# Altium schematic symbol library TI Power Management Shunt Voltage Reference.SchLib: 1526 symbols (part 16 of 18)
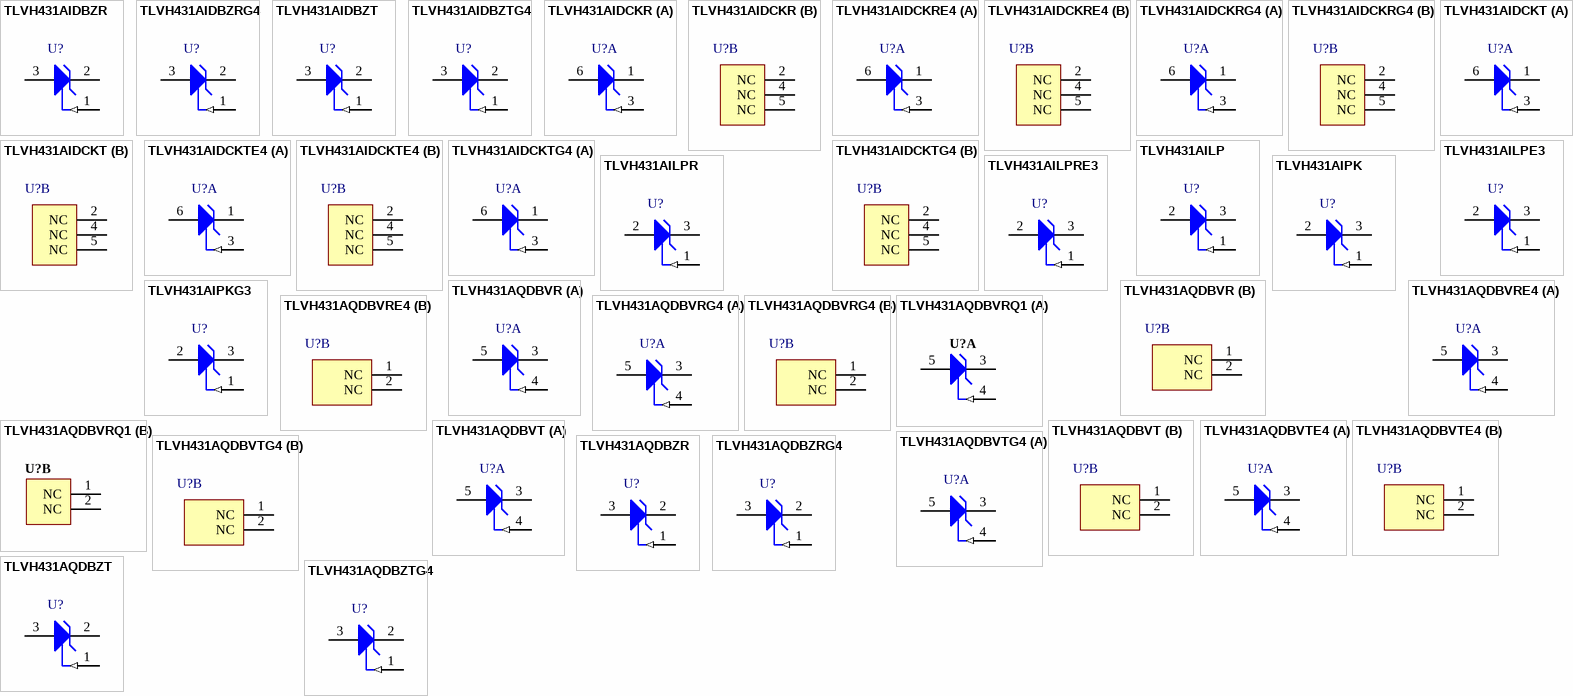
[diagram p72: symbols TLVH431AIDBZR to TLVH431AQDBZTG4]

## TLVH431AIDBZRG4
designator U?
Low-Voltage Adjustable Precision Shunt Regulator, 80 mA, -40 to 85 degC, 3-pin SOT-23 (DBZ), Green (RoHS & no Sb/Br); Manufacturer: Texas Instruments; PartNumber: TLVH431AIDBZRG4; Initial Accuracy @ 25/deg C(%): 1; Iout/Iz(Max)(mA): 80; Rating: Catalog; SubFamily: Shunt Voltage Reference; Temp Coeff(Max)(ppm/ degree C): 129; VO Adj(Max)(V): 18; VO Adj(Min)(V): 1.24; DatasheetVersion: SLVS555I; PackageVersion: 4203227/B; PackageReference: DBZ3; PackageDescription: 3-Pin Plastic Small Outline, Body 2.92 x 1.3 mm, Pitch 0.95 mm; Supplier 1: Digi-Key; Supplier Part Number 1: TLVH431AIDBZRG4-ND; Supplier 2: Mouser; Supplier Part Number 2: 595-TLVH431AIDBZRG4; Eco-Plan: Green (RoHS & no Sb/Br); Min Iz for Regulation(uA): 80; Mounting Technology: Surface Mount; Code_JEDEC: TO-236; ComponentLink1Description: Manufacturer URL; ComponentLink1URL: http://www.ti.com/; ComponentLink2Description: Datasheet; ComponentLink2URL: http://www.ti.com/general/docs/lit/getliterature.tsp?genericPartNumber=TLVH431A&fileType=pdf; ComponentLink3Description: Package Specification; ComponentLink3URL: http://www.ti.com/litv/pdf/mpds108a
footprint TI-DBZ3_N (SOT23, 3-Leads, Body 2.92x1.3 mm, Pitch 0.95 mm, IPC Medium Density)
pins: 1 REF (in), 2 CATHODE, 3 ANODE

## TLVH431AIDBZT
designator U?
Low-Voltage Adjustable Precision Shunt Regulator, 80 mA, -40 to 85 degC, 3-pin SOT-23 (DBZ), Green (RoHS & no Sb/Br); Manufacturer: Texas Instruments; PartNumber: TLVH431AIDBZT; Initial Accuracy @ 25/deg C(%): 1; Iout/Iz(Max)(mA): 80; Rating: Catalog; SubFamily: Shunt Voltage Reference; Temp Coeff(Max)(ppm/ degree C): 129; VO Adj(Max)(V): 18; VO Adj(Min)(V): 1.24; DatasheetVersion: SLVS555I; PackageVersion: 4203227/B; PackageReference: DBZ3; PackageDescription: 3-Pin Plastic Small Outline, Body 2.92 x 1.3 mm, Pitch 0.95 mm; Supplier 1: Digi-Key; Supplier Part Number 1: 296-26830-2-ND; Supplier 2: Digi-Key; Supplier Part Number 2: 296-26830-1-ND; Supplier 3: Digi-Key; Supplier Part Number 3: 296-26830-6-ND; Supplier 4: Mouser; Supplier Part Number 4: 595-TLVH431AIDBZT; Eco-Plan: Green (RoHS & no Sb/Br); Min Iz for Regulation(uA): 80; Mounting Technology: Surface Mount; Code_JEDEC: TO-236; ComponentLink1Description: Manufacturer URL; ComponentLink1URL: http://www.ti.com/; ComponentLink2Description: Datasheet; ComponentLink2URL: http://www.ti.com/general/docs/lit/getliterature.tsp?genericPartNumber=TLVH431A&fileType=pdf; ComponentLink3Description: Package Specification; ComponentLink3URL: http://www.ti.com/litv/pdf/mpds108a
footprint TI-DBZ3_N (SOT23, 3-Leads, Body 2.92x1.3 mm, Pitch 0.95 mm, IPC Medium Density)
pins: 1 REF (in), 2 CATHODE, 3 ANODE

## TLVH431AIDBZTG4
designator U?
Low-Voltage Adjustable Precision Shunt Regulator, 80 mA, -40 to 85 degC, 3-pin SOT-23 (DBZ), Green (RoHS & no Sb/Br); Manufacturer: Texas Instruments; PartNumber: TLVH431AIDBZTG4; Initial Accuracy @ 25/deg C(%): 1; Iout/Iz(Max)(mA): 80; Rating: Catalog; SubFamily: Shunt Voltage Reference; Temp Coeff(Max)(ppm/ degree C): 129; VO Adj(Max)(V): 18; VO Adj(Min)(V): 1.24; DatasheetVersion: SLVS555I; PackageVersion: 4203227/B; PackageReference: DBZ3; PackageDescription: 3-Pin Plastic Small Outline, Body 2.92 x 1.3 mm, Pitch 0.95 mm; Supplier 1: Digi-Key; Supplier Part Number 1: TLVH431AIDBZTG4-ND; Supplier 2: Newark; Supplier Part Number 2: 31K7653; Supplier 3: Mouser; Supplier Part Number 3: 595-TLVH431AIDBZTG4; Eco-Plan: Green (RoHS & no Sb/Br); Min Iz for Regulation(uA): 80; Mounting Technology: Surface Mount; Code_JEDEC: TO-236; ComponentLink1Description: Manufacturer URL; ComponentLink1URL: http://www.ti.com/; ComponentLink2Description: Datasheet; ComponentLink2URL: http://www.ti.com/general/docs/lit/getliterature.tsp?genericPartNumber=TLVH431A&fileType=pdf; ComponentLink3Description: Package Specification; ComponentLink3URL: http://www.ti.com/litv/pdf/mpds108a; ComponentLink4Description: URL Link1; ComponentLink4URL: Samples URL:http://www.ti.com/lit/ds/symlink/tlvh432.pdf
footprint TI-DBZ3_N (SOT23, 3-Leads, Body 2.92x1.3 mm, Pitch 0.95 mm, IPC Medium Density)
pins: 1 REF (in), 2 CATHODE, 3 ANODE

## TLVH431AIDCKR
designator U?
Low-Voltage Adjustable Precision Shunt Regulator, 80 mA, -40 to 85 degC, 6-pin SC70 (DCK), Green (RoHS & no Sb/Br); Manufacturer: Texas Instruments; PartNumber: TLVH431AIDCKR; Initial Accuracy @ 25/deg C(%): 1; Iout/Iz(Max)(mA): 80; Rating: Catalog; SubFamily: Shunt Voltage Reference; Temp Coeff(Max)(ppm/ degree C): 129; VO Adj(Max)(V): 18; VO Adj(Min)(V): 1.24; DatasheetVersion: SLVS555I; PackageReference: DCK6; PackageDescription: 6-Pin Plastic Small Outline, Body 2 x 1.25 mm, 0.65 mm Pitch, 2.1 mm Lead Span; Supplier 1: Digi-Key; Supplier Part Number 1: 296-18044-2-ND; Supplier 2: Digi-Key; Supplier Part Number 2: 296-18044-1-ND; Supplier 3: Digi-Key; Supplier Part Number 3: 296-18044-6-ND; Supplier 4: Mouser; Supplier Part Number 4: 595-TLVH431AIDCKR; Eco-Plan: Green (RoHS & no Sb/Br); Min Iz for Regulation(uA): 80; Mounting Technology: Surface Mount; Code_JEDEC: MO-203; ComponentLink1Description: Manufacturer URL; ComponentLink1URL: http://www.ti.com/; ComponentLink2Description: Datasheet; ComponentLink2URL: http://www.ti.com/general/docs/lit/getliterature.tsp?genericPartNumber=TLVH431A&fileType=pdf; ComponentLink3Description: Package Specification; ComponentLink3URL: http://www.ti.com/litv/pdf/mpds114c; ComponentLink4Description: URL Link1; ComponentLink4URL: Samples URL:http://www.ti.com/lit/ds/symlink/tlvh432.pdf
footprint TI-DCK6_V (SOT23, 6-Leads, Body 2x1.25mm, Pitch 0.65mm)
part A pins: 1 CATHODE, 3 REF (in), 6 ANODE
part B pins: 2 NC "No internal connection", 4 NC "No internal connection", 5 NC "No internal connection"

## TLVH431AIDCKRE4
designator U?
Low-Voltage Adjustable Precision Shunt Regulator, 80 mA, -40 to 85 degC, 6-pin SC70 (DCK), Green (RoHS & no Sb/Br); Manufacturer: Texas Instruments; PartNumber: TLVH431AIDCKRE4; Initial Accuracy @ 25/deg C(%): 1; Iout/Iz(Max)(mA): 80; Rating: Catalog; SubFamily: Shunt Voltage Reference; Temp Coeff(Max)(ppm/ degree C): 129; VO Adj(Max)(V): 18; VO Adj(Min)(V): 1.24; DatasheetVersion: SLVS555I; PackageReference: DCK6; PackageDescription: 6-Pin Plastic Small Outline, Body 2 x 1.25 mm, 0.65 mm Pitch, 2.1 mm Lead Span; Supplier 1: Digi-Key; Supplier Part Number 1: TLVH431AIDCKRE4-ND; Supplier 2: Mouser; Supplier Part Number 2: 595-TLVH431AIDCKRE4; Eco-Plan: Green (RoHS & no Sb/Br); Min Iz for Regulation(uA): 80; Mounting Technology: Surface Mount; Code_JEDEC: MO-203; ComponentLink1Description: Manufacturer URL; ComponentLink1URL: http://www.ti.com/; ComponentLink2Description: Datasheet; ComponentLink2URL: http://www.ti.com/general/docs/lit/getliterature.tsp?genericPartNumber=TLVH431A&fileType=pdf; ComponentLink3Description: Package Specification; ComponentLink3URL: http://www.ti.com/litv/pdf/mpds114c; ComponentLink4Description: URL Link1; ComponentLink4URL: Samples URL:http://www.ti.com/lit/ds/symlink/tlvh432.pdf
footprint TI-DCK6_V (SOT23, 6-Leads, Body 2x1.25mm, Pitch 0.65mm)
part A pins: 1 CATHODE, 3 REF (in), 6 ANODE
part B pins: 2 NC "No internal connection", 4 NC "No internal connection", 5 NC "No internal connection"

## TLVH431AIDCKRG4
designator U?
Low-Voltage Adjustable Precision Shunt Regulator, 80 mA, -40 to 85 degC, 6-pin SC70 (DCK), Green (RoHS & no Sb/Br); Manufacturer: Texas Instruments; PartNumber: TLVH431AIDCKRG4; Initial Accuracy @ 25/deg C(%): 1; Iout/Iz(Max)(mA): 80; Rating: Catalog; SubFamily: Shunt Voltage Reference; Temp Coeff(Max)(ppm/ degree C): 129; VO Adj(Max)(V): 18; VO Adj(Min)(V): 1.24; DatasheetVersion: SLVS555I; PackageReference: DCK6; PackageDescription: 6-Pin Plastic Small Outline, Body 2 x 1.25 mm, 0.65 mm Pitch, 2.1 mm Lead Span; Supplier 1: Digi-Key; Supplier Part Number 1: TLVH431AIDCKRG4-ND; Supplier 2: Newark; Supplier Part Number 2: 41M5444; Supplier 3: Mouser; Supplier Part Number 3: 595-TLVH431AIDCKRG4; Eco-Plan: Green (RoHS & no Sb/Br); Min Iz for Regulation(uA): 80; Mounting Technology: Surface Mount; Code_JEDEC: MO-203; ComponentLink1Description: Manufacturer URL; ComponentLink1URL: http://www.ti.com/; ComponentLink2Description: Datasheet; ComponentLink2URL: http://www.ti.com/general/docs/lit/getliterature.tsp?genericPartNumber=TLVH431A&fileType=pdf; ComponentLink3Description: Package Specification; ComponentLink3URL: http://www.ti.com/litv/pdf/mpds114c; ComponentLink4Description: URL Link1; ComponentLink4URL: Samples URL:http://www.ti.com/lit/ds/symlink/tlvh432.pdf
footprint TI-DCK6_V (SOT23, 6-Leads, Body 2x1.25mm, Pitch 0.65mm)
part A pins: 1 CATHODE, 3 REF (in), 6 ANODE
part B pins: 2 NC "No internal connection", 4 NC "No internal connection", 5 NC "No internal connection"

## TLVH431AIDCKT
designator U?
Low-Voltage Adjustable Precision Shunt Regulator, 80 mA, -40 to 85 degC, 6-pin SC70 (DCK), Green (RoHS & no Sb/Br); Manufacturer: Texas Instruments; PartNumber: TLVH431AIDCKT; Initial Accuracy @ 25/deg C(%): 1; Iout/Iz(Max)(mA): 80; Rating: Catalog; SubFamily: Shunt Voltage Reference; Temp Coeff(Max)(ppm/ degree C): 129; VO Adj(Max)(V): 18; VO Adj(Min)(V): 1.24; DatasheetVersion: SLVS555I; PackageReference: DCK6; PackageDescription: 6-Pin Plastic Small Outline, Body 2 x 1.25 mm, 0.65 mm Pitch, 2.1 mm Lead Span; Supplier 1: Digi-Key; Supplier Part Number 1: TLVH431AIDCKT-ND; Supplier 2: Mouser; Supplier Part Number 2: 595-TLVH431AIDCKT; Eco-Plan: Green (RoHS & no Sb/Br); Min Iz for Regulation(uA): 80; Mounting Technology: Surface Mount; Code_JEDEC: MO-203; ComponentLink1Description: Manufacturer URL; ComponentLink1URL: http://www.ti.com/; ComponentLink2Description: Datasheet; ComponentLink2URL: http://www.ti.com/general/docs/lit/getliterature.tsp?genericPartNumber=TLVH431A&fileType=pdf; ComponentLink3Description: Package Specification; ComponentLink3URL: http://www.ti.com/litv/pdf/mpds114c; ComponentLink4Description: URL Link1; ComponentLink4URL: Samples URL:http://www.ti.com/lit/ds/symlink/tlvh432.pdf
footprint TI-DCK6_V (SOT23, 6-Leads, Body 2x1.25mm, Pitch 0.65mm)
part A pins: 1 CATHODE, 3 REF (in), 6 ANODE
part B pins: 2 NC "No internal connection", 4 NC "No internal connection", 5 NC "No internal connection"

## TLVH431AIDCKTE4
designator U?
Low-Voltage Adjustable Precision Shunt Regulator, 80 mA, -40 to 85 degC, 6-pin SC70 (DCK), Green (RoHS & no Sb/Br); Manufacturer: Texas Instruments; PartNumber: TLVH431AIDCKTE4; Initial Accuracy @ 25/deg C(%): 1; Iout/Iz(Max)(mA): 80; Rating: Catalog; SubFamily: Shunt Voltage Reference; Temp Coeff(Max)(ppm/ degree C): 129; VO Adj(Max)(V): 18; VO Adj(Min)(V): 1.24; DatasheetVersion: SLVS555I; PackageReference: DCK6; PackageDescription: 6-Pin Plastic Small Outline, Body 2 x 1.25 mm, 0.65 mm Pitch, 2.1 mm Lead Span; Supplier 1: Digi-Key; Supplier Part Number 1: TLVH431AIDCKTE4-ND; Supplier 2: Mouser; Supplier Part Number 2: 595-TLVH431AIDCKTE4; Eco-Plan: Green (RoHS & no Sb/Br); Min Iz for Regulation(uA): 80; Mounting Technology: Surface Mount; Code_JEDEC: MO-203; ComponentLink1Description: Manufacturer URL; ComponentLink1URL: http://www.ti.com/; ComponentLink2Description: Datasheet; ComponentLink2URL: http://www.ti.com/general/docs/lit/getliterature.tsp?genericPartNumber=TLVH431A&fileType=pdf; ComponentLink3Description: Package Specification; ComponentLink3URL: http://www.ti.com/litv/pdf/mpds114c; ComponentLink4Description: URL Link1; ComponentLink4URL: Samples URL:http://www.ti.com/lit/ds/symlink/tlvh432.pdf
footprint TI-DCK6_V (SOT23, 6-Leads, Body 2x1.25mm, Pitch 0.65mm)
part A pins: 1 CATHODE, 3 REF (in), 6 ANODE
part B pins: 2 NC "No internal connection", 4 NC "No internal connection", 5 NC "No internal connection"

## TLVH431AIDCKTG4
designator U?
Low-Voltage Adjustable Precision Shunt Regulator, 80 mA, -40 to 85 degC, 6-pin SC70 (DCK), Green (RoHS & no Sb/Br); Manufacturer: Texas Instruments; PartNumber: TLVH431AIDCKTG4; Initial Accuracy @ 25/deg C(%): 1; Iout/Iz(Max)(mA): 80; Rating: Catalog; SubFamily: Shunt Voltage Reference; Temp Coeff(Max)(ppm/ degree C): 129; VO Adj(Max)(V): 18; VO Adj(Min)(V): 1.24; DatasheetVersion: SLVS555I; PackageReference: DCK6; PackageDescription: 6-Pin Plastic Small Outline, Body 2 x 1.25 mm, 0.65 mm Pitch, 2.1 mm Lead Span; Supplier 1: Digi-Key; Supplier Part Number 1: TLVH431AIDCKTG4-ND; Supplier 2: Newark; Supplier Part Number 2: 41M5445; Supplier 3: Mouser; Supplier Part Number 3: 595-TLVH431AIDCKTG4; Eco-Plan: Green (RoHS & no Sb/Br); Min Iz for Regulation(uA): 80; Mounting Technology: Surface Mount; Code_JEDEC: MO-203; ComponentLink1Description: Manufacturer URL; ComponentLink1URL: http://www.ti.com/; ComponentLink2Description: Datasheet; ComponentLink2URL: http://www.ti.com/general/docs/lit/getliterature.tsp?genericPartNumber=TLVH431A&fileType=pdf; ComponentLink3Description: Package Specification; ComponentLink3URL: http://www.ti.com/litv/pdf/mpds114c; ComponentLink4Description: URL Link1; ComponentLink4URL: Samples URL:http://www.ti.com/lit/ds/symlink/tlvh432.pdf
footprint TI-DCK6_V (SOT23, 6-Leads, Body 2x1.25mm, Pitch 0.65mm)
part A pins: 1 CATHODE, 3 REF (in), 6 ANODE
part B pins: 2 NC "No internal connection", 4 NC "No internal connection", 5 NC "No internal connection"

## TLVH431AILP
designator U?
Low-Voltage Adjustable Precision Shunt Regulator, 80 mA, -40 to 85 degC, 3-pin TO-92 (LP), Pb-Free (RoHS); Manufacturer: Texas Instruments; PartNumber: TLVH431AILP; Initial Accuracy @ 25/deg C(%): 1; Iout/Iz(Max)(mA): 80; Rating: Catalog; SubFamily: Shunt Voltage Reference; Temp Coeff(Max)(ppm/ degree C): 129; VO Adj(Max)(V): 18; VO Adj(Min)(V): 1.24; DatasheetVersion: SLVS555I; PackageVersion: 4040001-2/C; PackageReference: LP3; PackageDescription: Plastic Cylindrical Package, Formed Lead Option (TO-92); Supplier 1: Digi-Key; Supplier Part Number 1: 296-31399-ND; Supplier 2: Newark; Supplier Part Number 2: 52K5902; Supplier 3: Mouser; Supplier Part Number 3: 595-TLVH431AILP; Eco-Plan: Pb-Free (RoHS); Min Iz for Regulation(uA): 80; Mounting Technology: Through Hole; Code_JEDEC: TO-226; ComponentLink1Description: Manufacturer URL; ComponentLink1URL: http://www.ti.com/; ComponentLink2Description: Datasheet; ComponentLink2URL: http://www.ti.com/general/docs/lit/getliterature.tsp?genericPartNumber=TLVH431A&fileType=pdf; ComponentLink3Description: Package Specification; ComponentLink3URL: http://www.ti.com/litv/pdf/msot002a
footprint TI-LP3 (TO, Flat Index; 3 In-Line, Formed Axial Leads; Body Dia. 4.8mm; Leads 0.56 x 0.41 mm (max))
pins: 1 REF (in), 2 ANODE, 3 CATHODE

## TLVH431AILPE3
designator U?
Low-Voltage Adjustable Precision Shunt Regulator, 80 mA, -40 to 85 degC, 3-pin TO-92 (LP), Pb-Free (RoHS); Manufacturer: Texas Instruments; PartNumber: TLVH431AILPE3; Initial Accuracy @ 25/deg C(%): 1; Iout/Iz(Max)(mA): 80; Rating: Catalog; SubFamily: Shunt Voltage Reference; Temp Coeff(Max)(ppm/ degree C): 129; VO Adj(Max)(V): 18; VO Adj(Min)(V): 1.24; DatasheetVersion: SLVS555I; PackageVersion: 4040001-2/C; PackageReference: LP3; PackageDescription: Plastic Cylindrical Package, Formed Lead Option (TO-92); Supplier 1: Digi-Key; Supplier Part Number 1: TLVH431AILPE3-ND; Supplier 2: Mouser; Supplier Part Number 2: 595-TLVH431AILPE3; Eco-Plan: Pb-Free (RoHS); Min Iz for Regulation(uA): 80; Mounting Technology: Through Hole; Code_JEDEC: TO-226; ComponentLink1Description: Manufacturer URL; ComponentLink1URL: http://www.ti.com/; ComponentLink2Description: Datasheet; ComponentLink2URL: http://www.ti.com/general/docs/lit/getliterature.tsp?genericPartNumber=TLVH431A&fileType=pdf; ComponentLink3Description: Package Specification; ComponentLink3URL: http://www.ti.com/litv/pdf/msot002a
footprint TI-LP3 (TO, Flat Index; 3 In-Line, Formed Axial Leads; Body Dia. 4.8mm; Leads 0.56 x 0.41 mm (max))
pins: 1 REF (in), 2 ANODE, 3 CATHODE

## TLVH431AILPR
designator U?
Low-Voltage Adjustable Precision Shunt Regulator, 80 mA, -40 to 85 degC, 3-pin TO-92 (LP), Pb-Free (RoHS); Manufacturer: Texas Instruments; PartNumber: TLVH431AILPR; Initial Accuracy @ 25/deg C(%): 1; Iout/Iz(Max)(mA): 80; Rating: Catalog; SubFamily: Shunt Voltage Reference; Temp Coeff(Max)(ppm/ degree C): 129; VO Adj(Max)(V): 18; VO Adj(Min)(V): 1.24; DatasheetVersion: SLVS555I; PackageVersion: 4040001-2/C; PackageReference: LP3; PackageDescription: Plastic Cylindrical Package, Formed Lead Option (TO-92); Supplier 1: Digi-Key; Supplier Part Number 1: 296-21130-3-ND; Supplier 2: Digi-Key; Supplier Part Number 2: 296-21130-1-ND; Supplier 3: Newark; Supplier Part Number 3: 52K5903; Supplier 4: Mouser; Supplier Part Number 4: 595-TLVH431AILPR; Eco-Plan: Pb-Free (RoHS); Min Iz for Regulation(uA): 80; Mounting Technology: Through Hole; Code_JEDEC: TO-226; ComponentLink1Description: Manufacturer URL; ComponentLink1URL: http://www.ti.com/; ComponentLink2Description: Datasheet; ComponentLink2URL: http://www.ti.com/general/docs/lit/getliterature.tsp?genericPartNumber=TLVH431A&fileType=pdf; ComponentLink3Description: Package Specification; ComponentLink3URL: http://www.ti.com/litv/pdf/msot002a
footprint TI-LP3 (TO, Flat Index; 3 In-Line, Formed Axial Leads; Body Dia. 4.8mm; Leads 0.56 x 0.41 mm (max))
pins: 1 REF (in), 2 ANODE, 3 CATHODE

## TLVH431AILPRE3
designator U?
Low-Voltage Adjustable Precision Shunt Regulator, 80 mA, -40 to 85 degC, 3-pin TO-92 (LP), Pb-Free (RoHS); Manufacturer: Texas Instruments; PartNumber: TLVH431AILPRE3; Initial Accuracy @ 25/deg C(%): 1; Iout/Iz(Max)(mA): 80; Rating: Catalog; SubFamily: Shunt Voltage Reference; Temp Coeff(Max)(ppm/ degree C): 129; VO Adj(Max)(V): 18; VO Adj(Min)(V): 1.24; DatasheetVersion: SLVS555I; PackageVersion: 4040001-2/C; PackageReference: LP3; PackageDescription: Plastic Cylindrical Package, Formed Lead Option (TO-92); Supplier 1: Digi-Key; Supplier Part Number 1: TLVH431AILPRE3-ND; Supplier 2: Mouser; Supplier Part Number 2: 595-TLVH431AILPRE3; Eco-Plan: Pb-Free (RoHS); Min Iz for Regulation(uA): 80; Mounting Technology: Through Hole; Code_JEDEC: TO-226; ComponentLink1Description: Manufacturer URL; ComponentLink1URL: http://www.ti.com/; ComponentLink2Description: Datasheet; ComponentLink2URL: http://www.ti.com/general/docs/lit/getliterature.tsp?genericPartNumber=TLVH431A&fileType=pdf; ComponentLink3Description: Package Specification; ComponentLink3URL: http://www.ti.com/litv/pdf/msot002a
footprint TI-LP3 (TO, Flat Index; 3 In-Line, Formed Axial Leads; Body Dia. 4.8mm; Leads 0.56 x 0.41 mm (max))
pins: 1 REF (in), 2 ANODE, 3 CATHODE

## TLVH431AIPK
designator U?
Low-Voltage Adjustable Precision Shunt Regulator, 80 mA, -40 to 85 degC, 3-pin SOT-89 (PK), Green (RoHS & no Sb/Br); Manufacturer: Texas Instruments; PartNumber: TLVH431AIPK; Initial Accuracy @ 25/deg C(%): 1; Iout/Iz(Max)(mA): 80; Rating: Catalog; SubFamily: Shunt Voltage Reference; Temp Coeff(Max)(ppm/ degree C): 129; VO Adj(Max)(V): 18; VO Adj(Min)(V): 1.24; DatasheetVersion: SLVS555I; PackageVersion: 4040234/D; PackageReference: PK3; PackageDescription: 3-Pin Plastic Small Outline, Body 2.5 x 4.5 mm, Pitch 1.5 mm; Supplier 1: Digi-Key; Supplier Part Number 1: 296-18620-2-ND; Supplier 2: Digi-Key; Supplier Part Number 2: 296-18620-1-ND; Supplier 3: Digi-Key; Supplier Part Number 3: 296-18620-6-ND; Supplier 4: Newark; Supplier Part Number 4: 57K1239; Supplier 5: Mouser; Supplier Part Number 5: 595-TLVH431AIPK; Eco-Plan: Green (RoHS & no Sb/Br); Min Iz for Regulation(uA): 80; Mounting Technology: Surface Mount; Code_JEDEC: TO-243; ComponentLink1Description: Manufacturer URL; ComponentLink1URL: http://www.ti.com/; ComponentLink2Description: Datasheet; ComponentLink2URL: http://www.ti.com/general/docs/lit/getliterature.tsp?genericPartNumber=TLVH431A&fileType=pdf; ComponentLink3Description: Package Specification; ComponentLink3URL: http://www.ti.com/litv/pdf/mhsi001b
footprint TI-PK3_N (SOT89, 3-Leads, Body 4.5x2.5mm, Pitch 1.5mm, IPC Medium Density)
pins: 1 REF (in), 2 ANODE, 3 CATHODE

## TLVH431AIPKG3
designator U?
Low-Voltage Adjustable Precision Shunt Regulator, 80 mA, -40 to 85 degC, 3-pin SOT-89 (PK), Green (RoHS & no Sb/Br); Manufacturer: Texas Instruments; PartNumber: TLVH431AIPKG3; Initial Accuracy @ 25/deg C(%): 1; Iout/Iz(Max)(mA): 80; Rating: Catalog; SubFamily: Shunt Voltage Reference; Temp Coeff(Max)(ppm/ degree C): 129; VO Adj(Max)(V): 18; VO Adj(Min)(V): 1.24; DatasheetVersion: SLVS555I; PackageVersion: 4040234/D; PackageReference: PK3; PackageDescription: 3-Pin Plastic Small Outline, Body 2.5 x 4.5 mm, Pitch 1.5 mm; Supplier 1: Digi-Key; Supplier Part Number 1: 296-19343-2-ND; Supplier 2: Digi-Key; Supplier Part Number 2: 296-19343-1-ND; Supplier 3: Digi-Key; Supplier Part Number 3: 296-19343-6-ND; Supplier 4: Newark; Supplier Part Number 4: 66K4388; Supplier 5: Mouser; Supplier Part Number 5: 595-TLVH431AIPKG3; Eco-Plan: Green (RoHS & no Sb/Br); Min Iz for Regulation(uA): 80; Mounting Technology: Surface Mount; Code_JEDEC: TO-243; ComponentLink1Description: Manufacturer URL; ComponentLink1URL: http://www.ti.com/; ComponentLink2Description: Datasheet; ComponentLink2URL: http://www.ti.com/general/docs/lit/getliterature.tsp?genericPartNumber=TLVH431A&fileType=pdf; ComponentLink3Description: Package Specification; ComponentLink3URL: http://www.ti.com/litv/pdf/mhsi001b
footprint TI-PK3_N (SOT89, 3-Leads, Body 4.5x2.5mm, Pitch 1.5mm, IPC Medium Density)
pins: 1 REF (in), 2 ANODE, 3 CATHODE

## TLVH431AQDBVR
designator U?
Low-Voltage Adjustable Precision Shunt Regulator, 80 mA, -40 to 125 degC, 5-pin SOT-23 (DBV), Green (RoHS & no Sb/Br); Manufacturer: Texas Instruments; PartNumber: TLVH431AQDBVR; Initial Accuracy @ 25/deg C(%): 1; Iout/Iz(Max)(mA): 80; Rating: Catalog; SubFamily: Shunt Voltage Reference; Temp Coeff(Max)(ppm/ degree C): 129; VO Adj(Max)(V): 18; VO Adj(Min)(V): 1.24; DatasheetVersion: SLVS555I; PackageVersion: 4073253-4/K; PackageReference: DBV5; PackageDescription: 5-Pin Plastic Small Outline, Body 1.60 ?2.90 mm, Pitch 0.95 mm; Supplier 1: Digi-Key; Supplier Part Number 1: 296-17971-2-ND; Supplier 2: Digi-Key; Supplier Part Number 2: 296-17971-1-ND; Supplier 3: Digi-Key; Supplier Part Number 3: 296-17971-6-ND; Supplier 4: Mouser; Supplier Part Number 4: 595-TLVH431AQDBVR; Eco-Plan: Green (RoHS & no Sb/Br); Min Iz for Regulation(uA): 80; Mounting Technology: Surface Mount; Code_JEDEC: MO-178; ComponentLink1Description: Manufacturer URL; ComponentLink1URL: http://www.ti.com/; ComponentLink2Description: Datasheet; ComponentLink2URL: http://www.ti.com/general/docs/lit/getliterature.tsp?genericPartNumber=TLVH431A&fileType=pdf; ComponentLink3Description: Package Specification; ComponentLink3URL: http://www.ti.com/litv/pdf/mpds018i
footprint TI-DBV5_N (SOT23, 5-Leads, Body 2.9x1.6mm, Pitch 0.95mm, IPC Medium Density)
part A pins: 3 CATHODE, 4 REF (in), 5 ANODE
part B pins: 1 NC "No internal connection", 2 NC "No internal connection"

## TLVH431AQDBVRE4
designator U?
Low-Voltage Adjustable Precision Shunt Regulator, 80 mA, -40 to 125 degC, 5-pin SOT-23 (DBV), Green (RoHS & no Sb/Br); Manufacturer: Texas Instruments; PartNumber: TLVH431AQDBVRE4; Initial Accuracy @ 25/deg C(%): 1; Iout/Iz(Max)(mA): 80; Rating: Catalog; SubFamily: Shunt Voltage Reference; Temp Coeff(Max)(ppm/ degree C): 129; VO Adj(Max)(V): 18; VO Adj(Min)(V): 1.24; DatasheetVersion: SLVS555I; PackageVersion: 4073253-4/K; PackageReference: DBV5; PackageDescription: 5-Pin Plastic Small Outline, Body 1.60 ?2.90 mm, Pitch 0.95 mm; Supplier 1: Digi-Key; Supplier Part Number 1: TLVH431AQDBVRE4-ND; Supplier 2: Mouser; Supplier Part Number 2: 595-TLVH431AQDBVRE4; Eco-Plan: Green (RoHS & no Sb/Br); Min Iz for Regulation(uA): 80; Mounting Technology: Surface Mount; Code_JEDEC: MO-178; ComponentLink1Description: Manufacturer URL; ComponentLink1URL: http://www.ti.com/; ComponentLink2Description: Datasheet; ComponentLink2URL: http://www.ti.com/general/docs/lit/getliterature.tsp?genericPartNumber=TLVH431A&fileType=pdf; ComponentLink3Description: Package Specification; ComponentLink3URL: http://www.ti.com/litv/pdf/mpds018i
footprint TI-DBV5_N (SOT23, 5-Leads, Body 2.9x1.6mm, Pitch 0.95mm, IPC Medium Density)
part A pins: 3 CATHODE, 4 REF (in), 5 ANODE
part B pins: 1 NC "No internal connection", 2 NC "No internal connection"

## TLVH431AQDBVRG4
designator U?
Low-Voltage Adjustable Precision Shunt Regulator, 80 mA, -40 to 125 degC, 5-pin SOT-23 (DBV), Green (RoHS & no Sb/Br); Manufacturer: Texas Instruments; PartNumber: TLVH431AQDBVRG4; Initial Accuracy @ 25/deg C(%): 1; Iout/Iz(Max)(mA): 80; Rating: Catalog; SubFamily: Shunt Voltage Reference; Temp Coeff(Max)(ppm/ degree C): 129; VO Adj(Max)(V): 18; VO Adj(Min)(V): 1.24; DatasheetVersion: SLVS555I; PackageVersion: 4073253-4/K; PackageReference: DBV5; PackageDescription: 5-Pin Plastic Small Outline, Body 1.60 ?2.90 mm, Pitch 0.95 mm; Supplier 1: Digi-Key; Supplier Part Number 1: TLVH431AQDBVRG4-ND; Supplier 2: Newark; Supplier Part Number 2: 46M9030; Supplier 3: Mouser; Supplier Part Number 3: 595-TLVH431AQDBVRG4; Eco-Plan: Green (RoHS & no Sb/Br); Min Iz for Regulation(uA): 80; Mounting Technology: Surface Mount; Code_JEDEC: MO-178; ComponentLink1Description: Manufacturer URL; ComponentLink1URL: http://www.ti.com/; ComponentLink2Description: Datasheet; ComponentLink2URL: http://www.ti.com/general/docs/lit/getliterature.tsp?genericPartNumber=TLVH431A&fileType=pdf; ComponentLink3Description: Package Specification; ComponentLink3URL: http://www.ti.com/litv/pdf/mpds018i
footprint TI-DBV5_N (SOT23, 5-Leads, Body 2.9x1.6mm, Pitch 0.95mm, IPC Medium Density)
part A pins: 3 CATHODE, 4 REF (in), 5 ANODE
part B pins: 1 NC "No internal connection", 2 NC "No internal connection"

## TLVH431AQDBVRQ1
designator U?
Automotive Catalog Low-Voltage Adjustable Precision Shunt Regulator, 80 mA, -40 to 125 degC, 5-pin SOT-23 (DBV), Green (RoHS & no Sb/Br); Manufacturer: Texas Instruments; PartNumber: TLVH431AQDBVRQ1; Initial Accuracy @ 25/deg C(%): 1; Iout/Iz(Max)(mA): 80; SubFamily: Shunt Voltage Reference; Temp Coeff(Max)(ppm/ degree C): 129; VO Adj(Max)(V): 18; VO Adj(Min)(V): 1.24; DatasheetVersion: SLVS906B; PackageVersion: 4073253-4/K; PackageReference: DBV5; PackageDescription: 5-Pin Plastic Small Outline, Body 1.60 ?2.90 mm, Pitch 0.95 mm; Supplier 1: Digi-Key; Supplier Part Number 1: 296-29780-2-ND; Supplier 2: Digi-Key; Supplier Part Number 2: 296-29780-1-ND; Supplier 3: Digi-Key; Supplier Part Number 3: 296-29780-6-ND; Supplier 4: Newark; Supplier Part Number 4: 24R9997; Supplier 5: Mouser; Supplier Part Number 5: 595-TLVH431AQDBVRQ1; Eco-Plan: Green (RoHS & no Sb/Br); Min Iz for Regulation(uA): 80; Rating: Automotive; Mounting Technology: Surface Mount; Code_JEDEC: MO-178; ComponentLink1Description: Manufacturer URL; ComponentLink1URL: http://www.ti.com/; ComponentLink2Description: Datasheet; ComponentLink2URL: http://www.ti.com/general/docs/lit/getliterature.tsp?genericPartNumber=TLVH431A-Q1&fileType=pdf; ComponentLink3Description: Package Specification; ComponentLink3URL: http://www.ti.com/litv/pdf/mpds018i
footprint TI-DBV5_N (SOT23, 5-Leads, Body 2.9x1.6mm, Pitch 0.95mm, IPC Medium Density)
part A pins: 3 CATHODE, 4 REF (in), 5 ANODE
part B pins: 1 NC "NO internal connection", 2 NC "Pin 2 is attached to Substrate and must be connected to ANODE or left open."

## TLVH431AQDBVT
designator U?
Low-Voltage Adjustable Precision Shunt Regulator, 80 mA, -40 to 125 degC, 5-pin SOT-23 (DBV), Green (RoHS & no Sb/Br); Manufacturer: Texas Instruments; PartNumber: TLVH431AQDBVT; Initial Accuracy @ 25/deg C(%): 1; Iout/Iz(Max)(mA): 80; Rating: Catalog; SubFamily: Shunt Voltage Reference; Temp Coeff(Max)(ppm/ degree C): 129; VO Adj(Max)(V): 18; VO Adj(Min)(V): 1.24; DatasheetVersion: SLVS555I; PackageVersion: 4073253-4/K; PackageReference: DBV5; PackageDescription: 5-Pin Plastic Small Outline, Body 1.60 ?2.90 mm, Pitch 0.95 mm; Supplier 1: Digi-Key; Supplier Part Number 1: TLVH431AQDBVT-ND; Supplier 2: Mouser; Supplier Part Number 2: 595-TLVH431AQDBVT; Eco-Plan: Green (RoHS & no Sb/Br); Min Iz for Regulation(uA): 80; Mounting Technology: Surface Mount; Code_JEDEC: MO-178; ComponentLink1Description: Manufacturer URL; ComponentLink1URL: http://www.ti.com/; ComponentLink2Description: Datasheet; ComponentLink2URL: http://www.ti.com/general/docs/lit/getliterature.tsp?genericPartNumber=TLVH431A&fileType=pdf; ComponentLink3Description: Package Specification; ComponentLink3URL: http://www.ti.com/litv/pdf/mpds018i
footprint TI-DBV5_N (SOT23, 5-Leads, Body 2.9x1.6mm, Pitch 0.95mm, IPC Medium Density)
part A pins: 3 CATHODE, 4 REF (in), 5 ANODE
part B pins: 1 NC "No internal connection", 2 NC "No internal connection"
